# Altium schematic symbol library LATTICEPLDS_Library.SchLib: 291 symbols (part 8 of 32) (continued)
## LFE2-20E-F672 (continued)
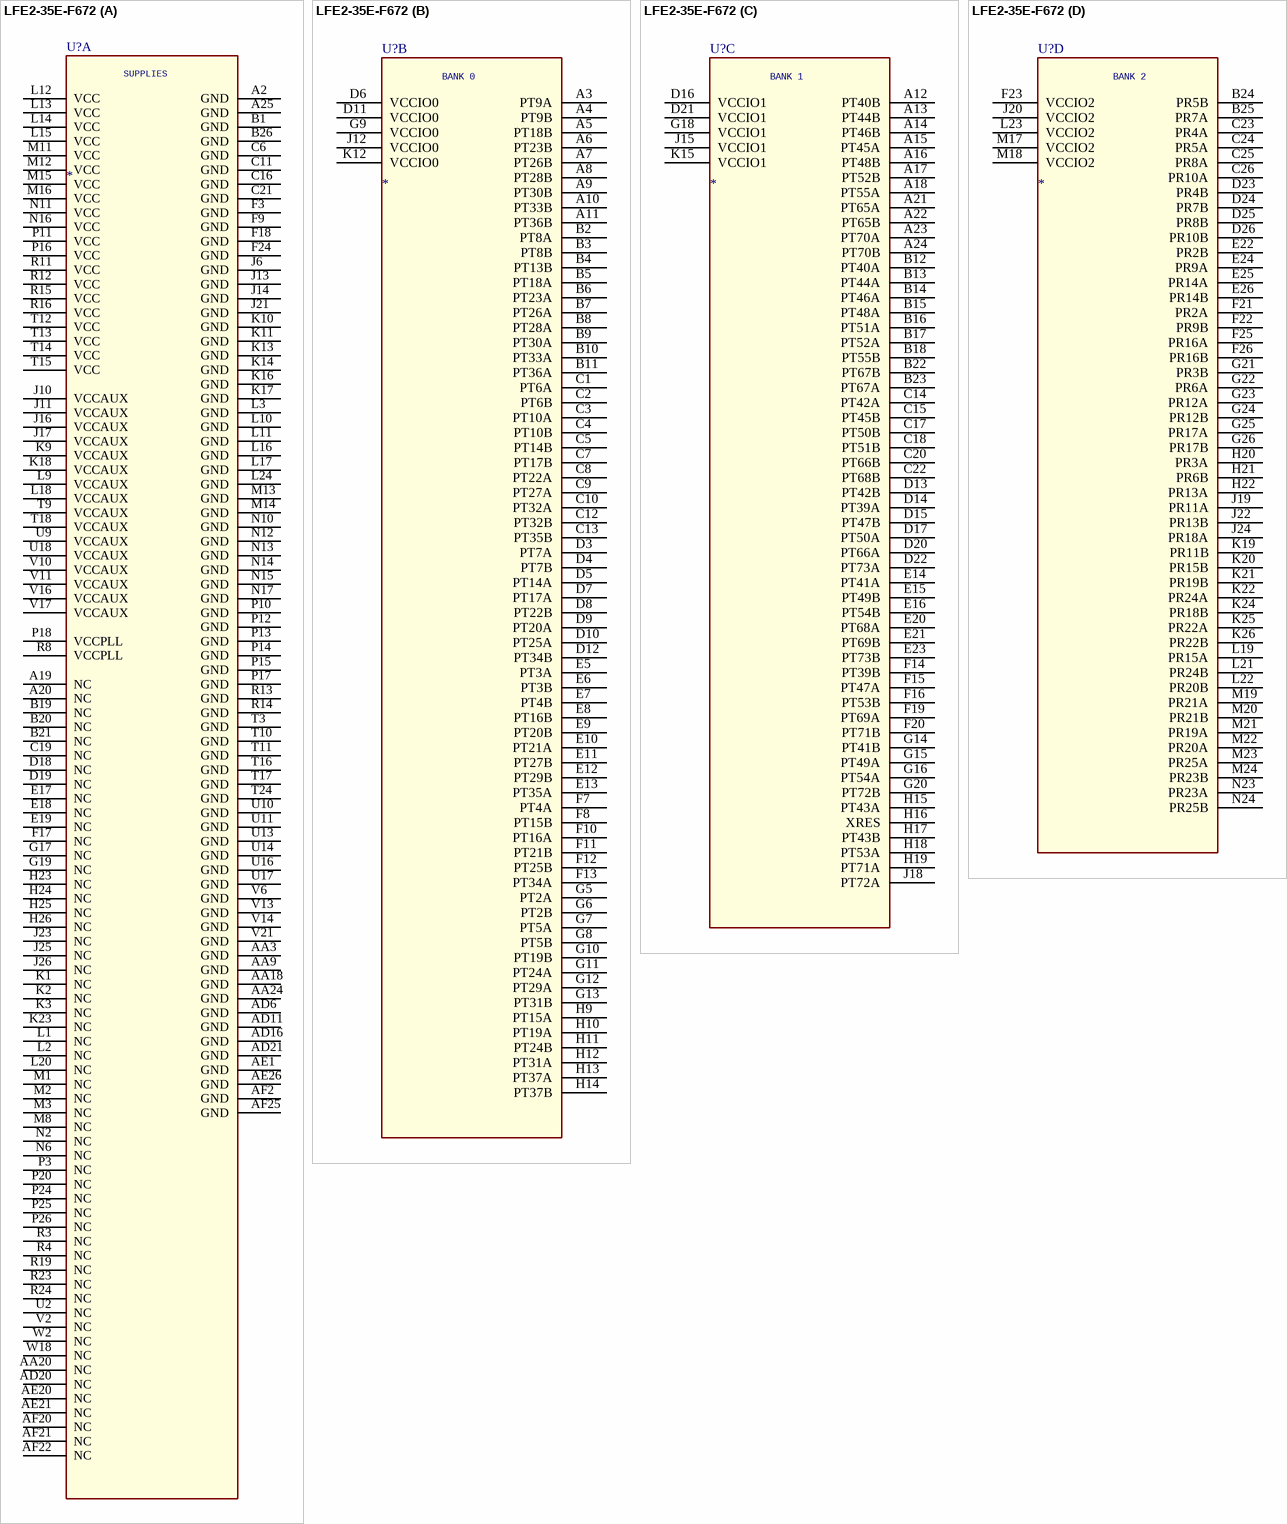
[diagram p83: symbol LFE2-35E-F672]
part A text: SUPPLIES
part B text: BANK0
part C text: BANK1
part D text: BANK2
part E text: BANK3
part F text: BANK4
part G text: BANK5
part H text: BANK6
part I text: BANK7
part J text: BANK8

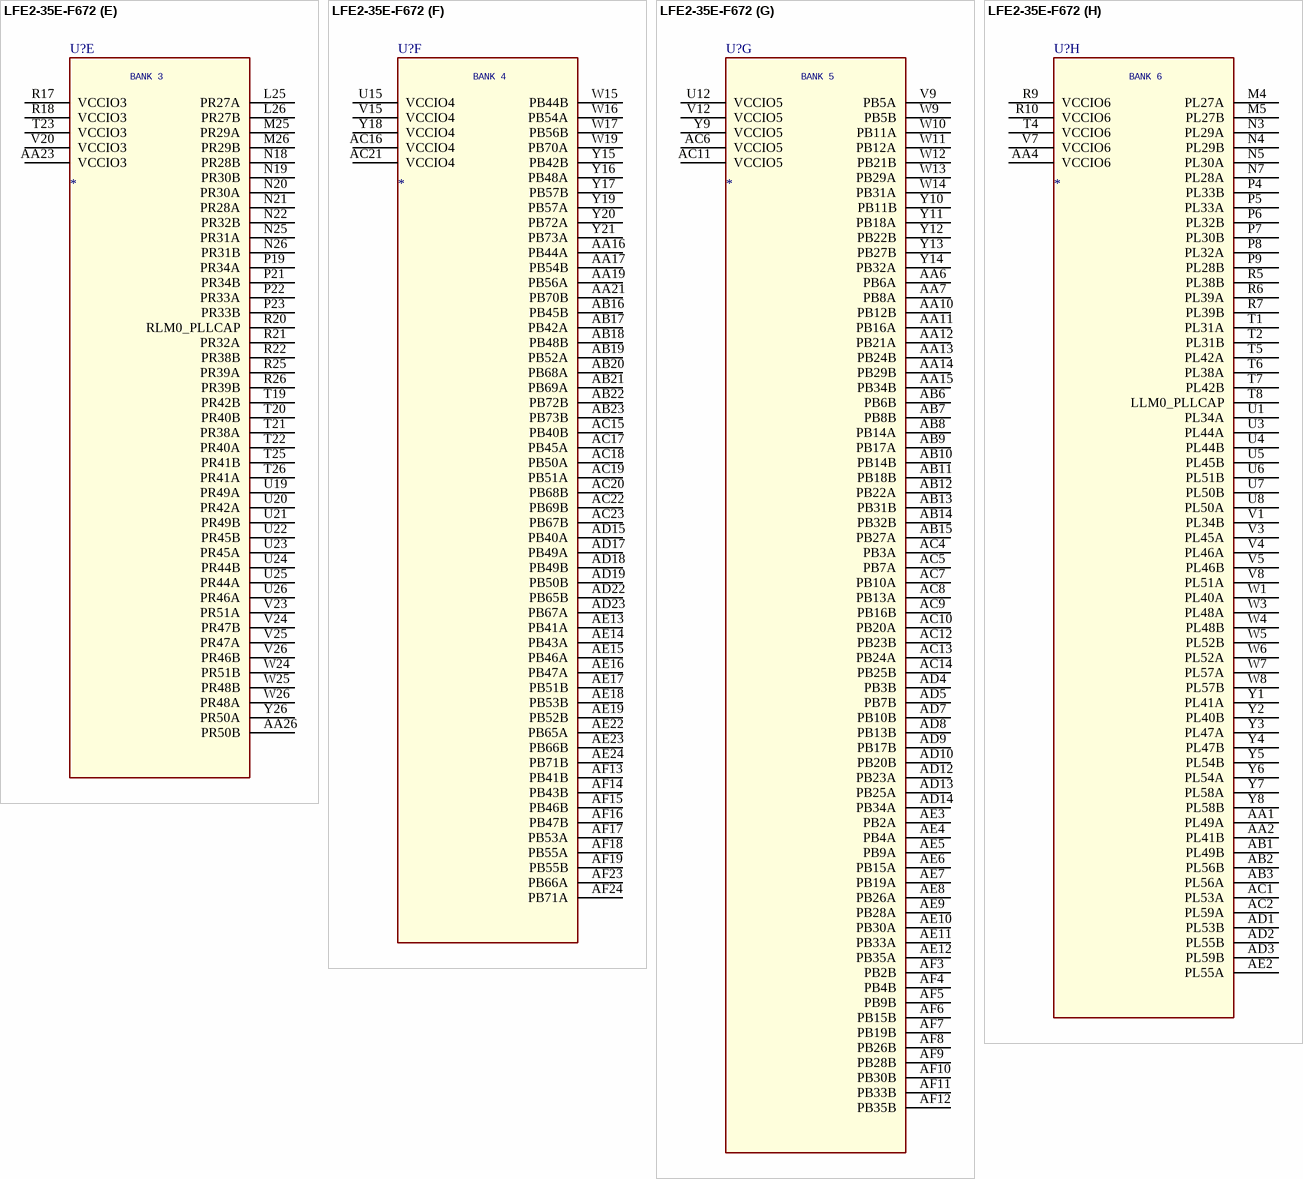
[diagram p84: symbol LFE2-35E-F672]

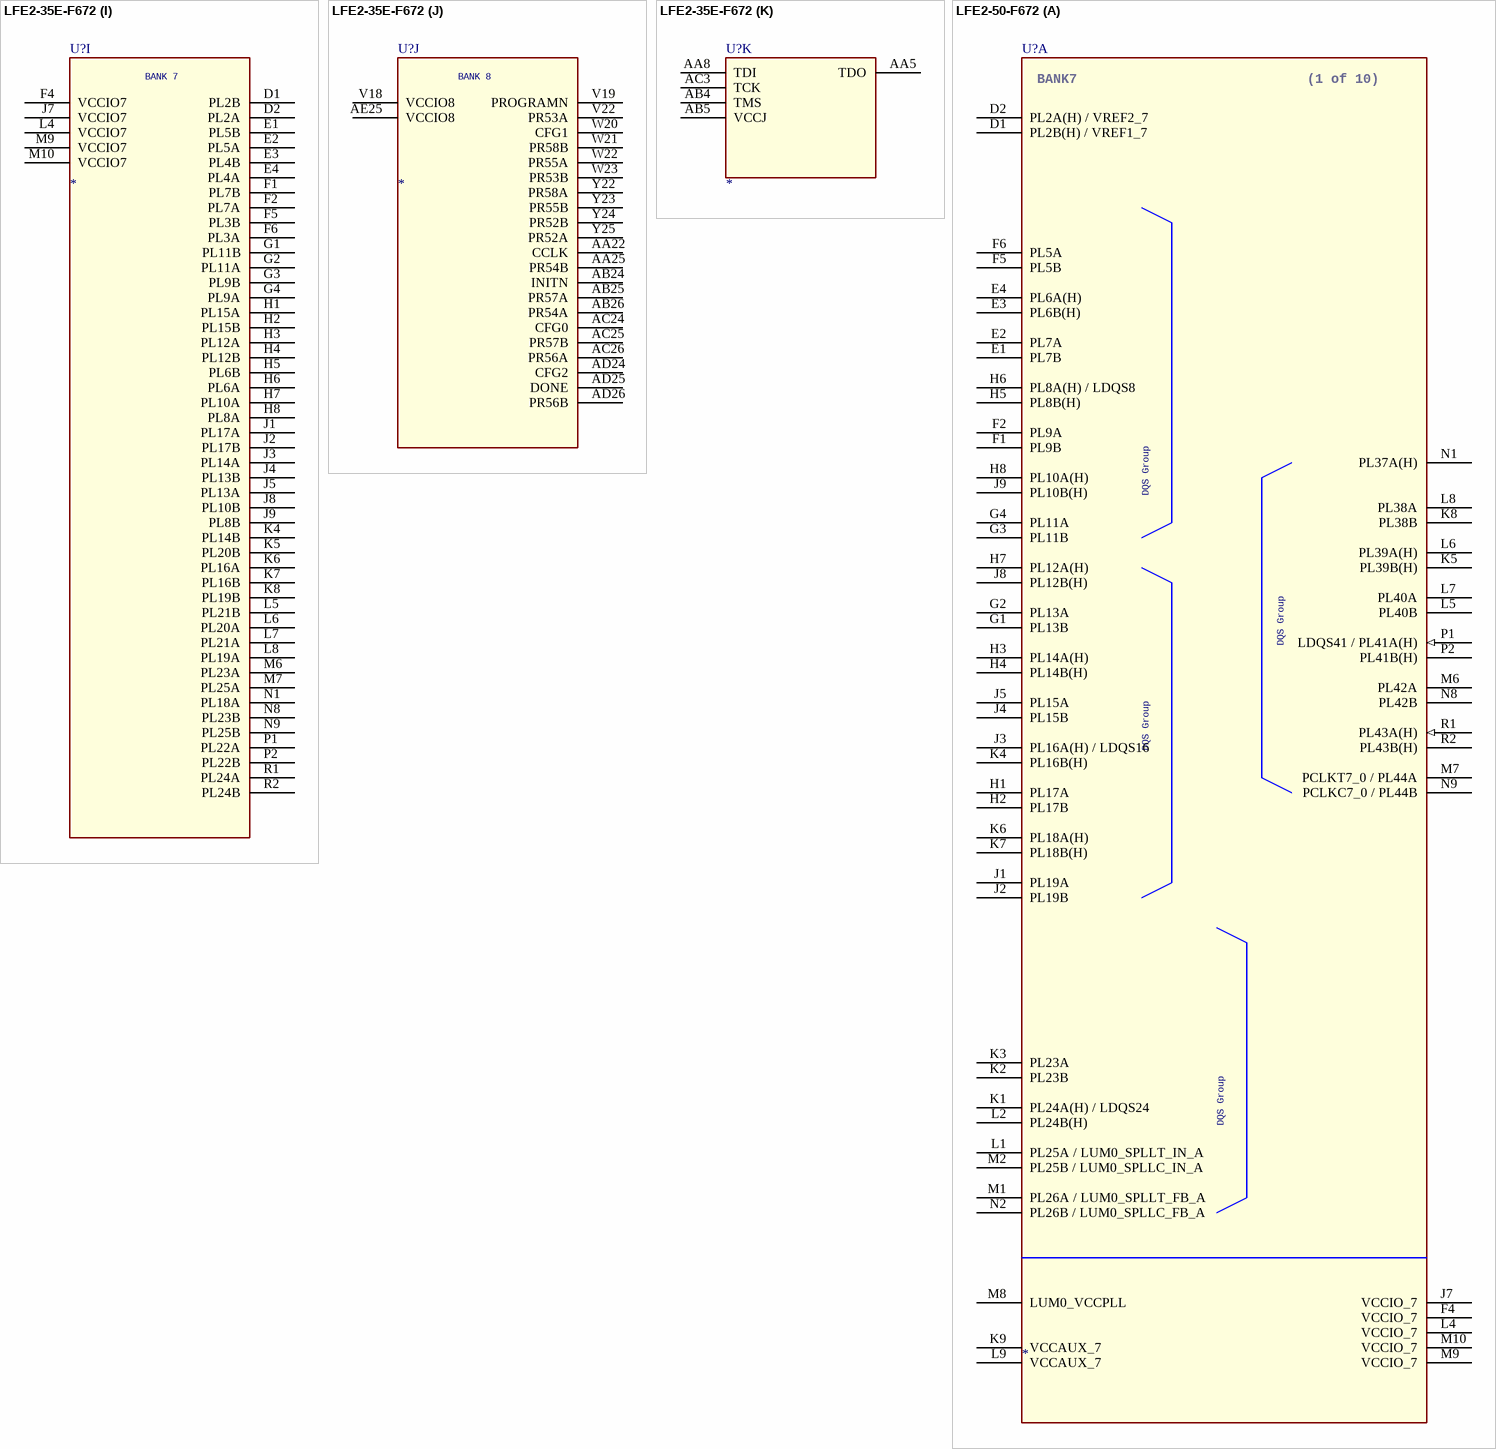
[diagram p85: symbols LFE2-35E-F672 to LFE2-50-F672]

## LFE2-35E-F672
designator U?
SPLIT_INST: TRUE; SWAP_INFO: (S1+S2+S3+S4+S5+S6+S7+S8+S9+S10+S11)
part A pins: A2 GND (power), A19 NC, A20 NC, A25 GND (power), AA3 GND (power), AA9 GND (power), AA18 GND (power), AA20 NC, AA24 GND (power), AD6 GND (power), AD11 GND (power), AD16 GND (power), AD20 NC, AD21 GND (power), AE1 GND (power), AE20 NC, AE21 NC, AE26 GND (power), AF2 GND (power), AF20 NC, AF21 NC, AF22 NC, AF25 GND (power), B1 GND (power), B19 NC, B20 NC, B21 NC, B26 GND (power), C6 GND (power), C11 GND (power), C16 GND (power), C19 NC, C21 GND (power), D18 NC, D19 NC, E17 NC, E18 NC, E19 NC, F3 GND (power), F9 GND (power), F17 NC, F18 GND (power), F24 GND (power), G17 NC, G19 NC, H23 NC, H24 NC, H25 NC, H26 NC, J6 GND (power), J10 VCCAUX (power), J11 VCCAUX (power), J13 GND (power), J14 GND (power), J16 VCCAUX (power), J17 VCCAUX (power), J21 GND (power), J23 NC, J25 NC, J26 NC, K1 NC, K2 NC, K3 NC, K9 VCCAUX (power), K10 GND (power), K11 GND (power), K13 GND (power), K14 GND (power), K16 GND (power), K17 GND (power), K18 VCCAUX (power), K23 NC, L1 NC, L2 NC, L3 GND (power), L9 VCCAUX (power), L10 GND (power), L11 GND (power), L12 VCC (power), L13 VCC (power), L14 VCC (power), L15 VCC (power), L16 GND (power), L17 GND (power), L18 VCCAUX (power), L20 NC, L24 GND (power), M1 NC, M2 NC, M3 NC, M8 NC, M11 VCC (power), M12 VCC (power), M13 GND (power), M14 GND (power), M15 VCC (power), M16 VCC (power), N2 NC, N6 NC, N10 GND (power), N11 VCC (power), N12 GND (power), N13 GND (power), N14 GND (power), N15 GND (power), N16 VCC (power), N17 GND (power), P3 NC, P10 GND (power), P11 VCC (power), P12 GND (power), P13 GND (power), P14 GND (power), P15 GND (power), P16 VCC (power), P17 GND (power), P18 VCCPLL (power), P20 NC, P24 NC, P25 NC, P26 NC, R3 NC, R4 NC, R8 VCCPLL (power), R11 VCC (power), R12 VCC (power), R13 GND (power), R14 GND (power), R15 VCC (power), R16 VCC (power), R19 NC, R23 NC, R24 NC, T3 GND (power), T9 VCCAUX (power), T10 GND (power), T11 GND (power), T12 VCC (power), T13 VCC (power), T14 VCC (power), T15 VCC (power), T16 GND (power), T17 GND (power), T18 VCCAUX (power), T24 GND (power), U2 NC, U9 VCCAUX (power), U10 GND (power), U11 GND (power), U13 GND (power), U14 GND (power), U16 GND (power), U17 GND (power), U18 VCCAUX (power), V2 NC, V6 GND (power), V10 VCCAUX (power), V11 VCCAUX (power), V13 GND (power), V14 GND (power), V16 VCCAUX (power), V17 VCCAUX (power), V21 GND (power), W2 NC, W18 NC
part B pins: A3 PT9A, A4 PT9B, A5 PT18B, A6 PT23B, A7 PT26B, A8 PT28B, A9 PT30B, A10 PT33B, A11 PT36B, B2 PT8A, B3 PT8B, B4 PT13B, B5 PT18A, B6 PT23A, B7 PT26A, B8 PT28A, B9 PT30A, B10 PT33A, B11 PT36A, C1 PT6A, C2 PT6B, C3 PT10A, C4 PT10B, C5 PT14B, C7 PT17B, C8 PT22A, C9 PT27A, C10 PT32A, C12 PT32B, C13 PT35B, D3 PT7A, D4 PT7B, D5 PT14A, D6 VCCIO0 (power), D7 PT17A, D8 PT22B, D9 PT20A, D10 PT25A, D11 VCCIO0 (power), D12 PT34B, E5 PT3A, E6 PT3B, E7 PT4B, E8 PT16B, E9 PT20B, E10 PT21A, E11 PT27B, E12 PT29B, E13 PT35A, F7 PT4A, F8 PT15B, F10 PT16A, F11 PT21B, F12 PT25B, F13 PT34A, G5 PT2A, G6 PT2B, G7 PT5A, G8 PT5B, G9 VCCIO0 (power), G10 PT19B, G11 PT24A, G12 PT29A, G13 PT31B, H9 PT15A, H10 PT19A, H11 PT24B, H12 PT31A, H13 PT37A, H14 PT37B, J12 VCCIO0 (power), K12 VCCIO0 (power)
part C pins: A12 PT40B, A13 PT44B, A14 PT46B, A15 PT45A, A16 PT48B, A17 PT52B, A18 PT55A, A21 PT65A, A22 PT65B, A23 PT70A, A24 PT70B, B12 PT40A, B13 PT44A, B14 PT46A, B15 PT48A, B16 PT51A, B17 PT52A, B18 PT55B, B22 PT67B, B23 PT67A, C14 PT42A, C15 PT45B, C17 PT50B, C18 PT51B, C20 PT66B, C22 PT68B, D13 PT42B, D14 PT39A, D15 PT47B, D16 VCCIO1 (power), D17 PT50A, D20 PT66A, D21 VCCIO1 (power), D22 PT73A, E14 PT41A, E15 PT49B, E16 PT54B, E20 PT68A, E21 PT69B, E23 PT73B, F14 PT39B, F15 PT47A, F16 PT53B, F19 PT69A, F20 PT71B, G14 PT41B, G15 PT49A, G16 PT54A, G18 VCCIO1 (power), G20 PT72B, H15 PT43A, H16 XRES, H17 PT43B, H18 PT53A, H19 PT71A, J15 VCCIO1 (power), J18 PT72A, K15 VCCIO1 (power)
part D pins: B24 PR5B, B25 PR7A, C23 PR4A, C24 PR5A, C25 PR8A, C26 PR10A, D23 PR4B, D24 PR7B, D25 PR8B, D26 PR10B, E22 PR2B, E24 PR9A, E25 PR14A, E26 PR14B, F21 PR2A, F22 PR9B, F23 VCCIO2 (power), F25 PR16A, F26 PR16B, G21 PR3B, G22 PR6A, G23 PR12A, G24 PR12B, G25 PR17A, G26 PR17B, H20 PR3A, H21 PR6B, H22 PR13A, J19 PR11A, J20 VCCIO2 (power), J22 PR13B, J24 PR18A, K19 PR11B, K20 PR15B, K21 PR19B, K22 PR24A, K24 PR18B, K25 PR22A, K26 PR22B, L19 PR15A, L21 PR24B, L22 PR20B, L23 VCCIO2 (power), M17 VCCIO2 (power), M18 VCCIO2 (power), M19 PR21A, M20 PR21B, M21 PR19A, M22 PR20A, M23 PR25A, M24 PR23B, N23 PR23A, N24 PR25B
part E pins: AA23 VCCIO3 (power), AA26 PR50B, L25 PR27A, L26 PR27B, M25 PR29A, M26 PR29B, N18 PR28B, N19 PR30B, N20 PR30A, N21 PR28A, N22 PR32B, N25 PR31A, N26 PR31B, P19 PR34A, P21 PR34B, P22 PR33A, P23 PR33B, R17 VCCIO3 (power), R18 VCCIO3 (power), R20 RLM0_PLLCAP, R21 PR32A, R22 PR38B, R25 PR39A, R26 PR39B, T19 PR42B, T20 PR40B, T21 PR38A, T22 PR40A, T23 VCCIO3 (power), T25 PR41B, T26 PR41A, U19 PR49A, U20 PR42A, U21 PR49B, U22 PR45B, U23 PR45A, U24 PR44B, U25 PR44A, U26 PR46A, V20 VCCIO3 (power), V23 PR51A, V24 PR47B, V25 PR47A, V26 PR46B, W24 PR51B, W25 PR48B, W26 PR48A, Y26 PR50A
part F pins: AA16 PB44A, AA17 PB54B, AA19 PB56A, AA21 PB70B, AB16 PB45B, AB17 PB42A, AB18 PB48B, AB19 PB52A, AB20 PB68A, AB21 PB69A, AB22 PB72B, AB23 PB73B, AC15 PB40B, AC16 VCCIO4 (power), AC17 PB45A, AC18 PB50A, AC19 PB51A, AC20 PB68B, AC21 VCCIO4 (power), AC22 PB69B, AC23 PB67B, AD15 PB40A, AD17 PB49A, AD18 PB49B, AD19 PB50B, AD22 PB65B, AD23 PB67A, AE13 PB41A, AE14 PB43A, AE15 PB46A, AE16 PB47A, AE17 PB51B, AE18 PB53B, AE19 PB52B, AE22 PB65A, AE23 PB66B, AE24 PB71B, AF13 PB41B, AF14 PB43B, AF15 PB46B, AF16 PB47B, AF17 PB53A, AF18 PB55A, AF19 PB55B, AF23 PB66A, AF24 PB71A, U15 VCCIO4 (power), V15 VCCIO4 (power), W15 PB44B, W16 PB54A, W17 PB56B, W19 PB70A, Y15 PB42B, Y16 PB48A, Y17 PB57B, Y18 VCCIO4 (power), Y19 PB57A, Y20 PB72A, Y21 PB73A
part G pins: AA6 PB6A, AA7 PB8A, AA10 PB12B, AA11 PB16A, AA12 PB21A, AA13 PB24B, AA14 PB29B, AA15 PB34B, AB6 PB6B, AB7 PB8B, AB8 PB14A, AB9 PB17A, AB10 PB14B, AB11 PB18B, AB12 PB22A, AB13 PB31B, AB14 PB32B, AB15 PB27A, AC4 PB3A, AC5 PB7A, AC6 VCCIO5 (power), AC7 PB10A, AC8 PB13A, AC9 PB16B, AC10 PB20A, AC11 VCCIO5 (power), AC12 PB23B, AC13 PB24A, AC14 PB25B, AD4 PB3B, AD5 PB7B, AD7 PB10B, AD8 PB13B, AD9 PB17B, AD10 PB20B, AD12 PB23A, AD13 PB25A, AD14 PB34A, AE3 PB2A, AE4 PB4A, AE5 PB9A, AE6 PB15A, AE7 PB19A, AE8 PB26A, AE9 PB28A, AE10 PB30A, AE11 PB33A, AE12 PB35A, AF3 PB2B, AF4 PB4B, AF5 PB9B, AF6 PB15B, AF7 PB19B, AF8 PB26B, AF9 PB28B, AF10 PB30B, AF11 PB33B, AF12 PB35B, U12 VCCIO5 (power), V9 PB5A, V12 VCCIO5 (power), W9 PB5B, W10 PB11A, W11 PB12A, W12 PB21B, W13 PB29A, W14 PB31A, Y9 VCCIO5 (power), Y10 PB11B, Y11 PB18A, Y12 PB22B, Y13 PB27B, Y14 PB32A
part H pins: AA1 PL49A, AA2 PL41B, AA4 VCCIO6 (power), AB1 PL49B, AB2 PL56B, AB3 PL56A, AC1 PL53A, AC2 PL59A, AD1 PL53B, AD2 PL55B, AD3 PL59B, AE2 PL55A, M4 PL27A, M5 PL27B, N3 PL29A, N4 PL29B, N5 PL30A, N7 PL28A, P4 PL33B, P5 PL33A, P6 PL32B, P7 PL30B, P8 PL32A, P9 PL28B, R5 PL38B, R6 PL39A, R7 PL39B, R9 VCCIO6 (power), R10 VCCIO6 (power), T1 PL31A, T2 PL31B, T4 VCCIO6 (power), T5 PL42A, T6 PL38A, T7 PL42B, T8 LLM0_PLLCAP, U1 PL34A, U3 PL44A, U4 PL44B, U5 PL45B, U6 PL51B, U7 PL50B, U8 PL50A, V1 PL34B, V3 PL45A, V4 PL46A, V5 PL46B, V7 VCCIO6 (power), V8 PL51A, W1 PL40A, W3 PL48A, W4 PL48B, W5 PL52B, W6 PL52A, W7 PL57A, W8 PL57B, Y1 PL41A, Y2 PL40B, Y3 PL47A, Y4 PL47B, Y5 PL54B, Y6 PL54A, Y7 PL58A, Y8 PL58B
part I pins: D1 PL2B, D2 PL2A, E1 PL5B, E2 PL5A, E3 PL4B, E4 PL4A, F1 PL7B, F2 PL7A, F4 VCCIO7 (power), F5 PL3B, F6 PL3A, G1 PL11B, G2 PL11A, G3 PL9B, G4 PL9A, H1 PL15A, H2 PL15B, H3 PL12A, H4 PL12B, H5 PL6B, H6 PL6A, H7 PL10A, H8 PL8A, J1 PL17A, J2 PL17B, J3 PL14A, J4 PL13B, J5 PL13A, J7 VCCIO7 (power), J8 PL10B, J9 PL8B, K4 PL14B, K5 PL20B, K6 PL16A, K7 PL16B, K8 PL19B, L4 VCCIO7 (power), L5 PL21B, L6 PL20A, L7 PL21A, L8 PL19A, M6 PL23A, M7 PL25A, M9 VCCIO7 (power), M10 VCCIO7 (power), N1 PL18A, N8 PL23B, N9 PL25B, P1 PL22A, P2 PL22B, R1 PL24A, R2 PL24B
part J pins: AA22 CCLK, AA25 PR54B, AB24 INITN, AB25 PR57A, AB26 PR54A, AC24 CFG0, AC25 PR57B, AC26 PR56A, AD24 CFG2, AD25 DONE, AD26 PR56B, AE25 VCCIO8 (power), V18 VCCIO8 (power), V19 PROGRAMN, V22 PR53A, W20 CFG1, W21 PR58B, W22 PR55A, W23 PR53B, Y22 PR58A, Y23 PR55B, Y24 PR52B, Y25 PR52A
part K pins: AA5 TDO, AA8 TDI, AB4 TMS, AB5 VCCJ, AC3 TCK
part A text: SUPPLIES
part B text: BANK 0
part C text: BANK 1
part D text: BANK 2
part E text: BANK 3
part F text: BANK 4
part G text: BANK 5
part H text: BANK 6
part I text: BANK 7
part J text: BANK 8

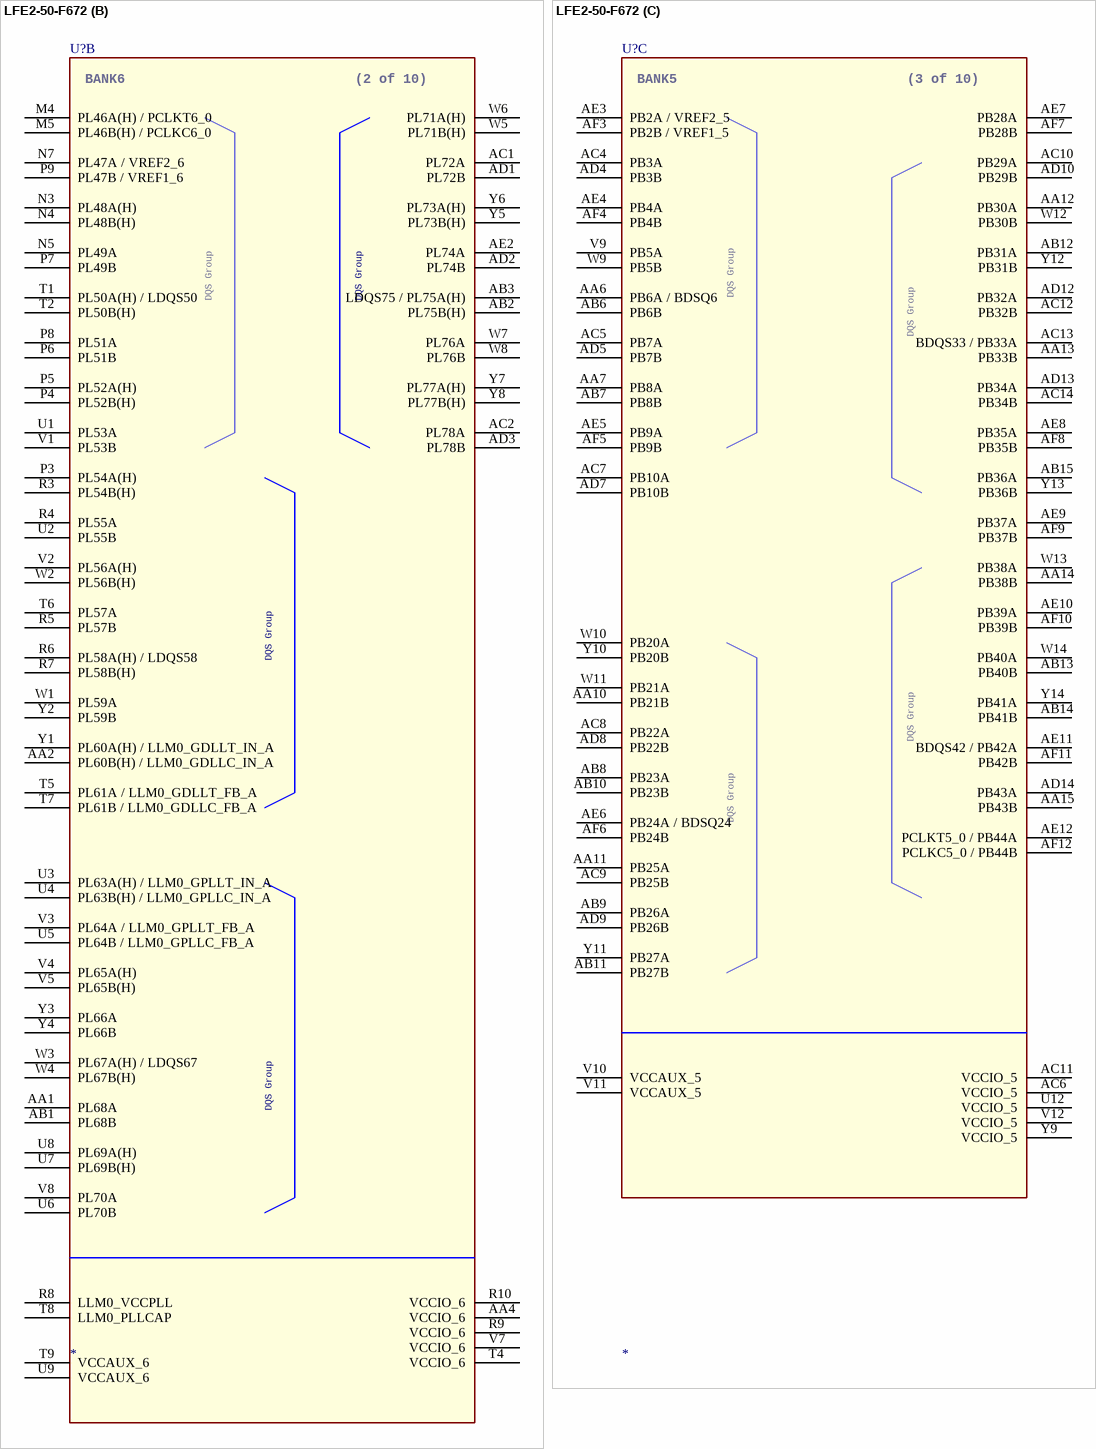
[diagram p86: symbol LFE2-50-F672]

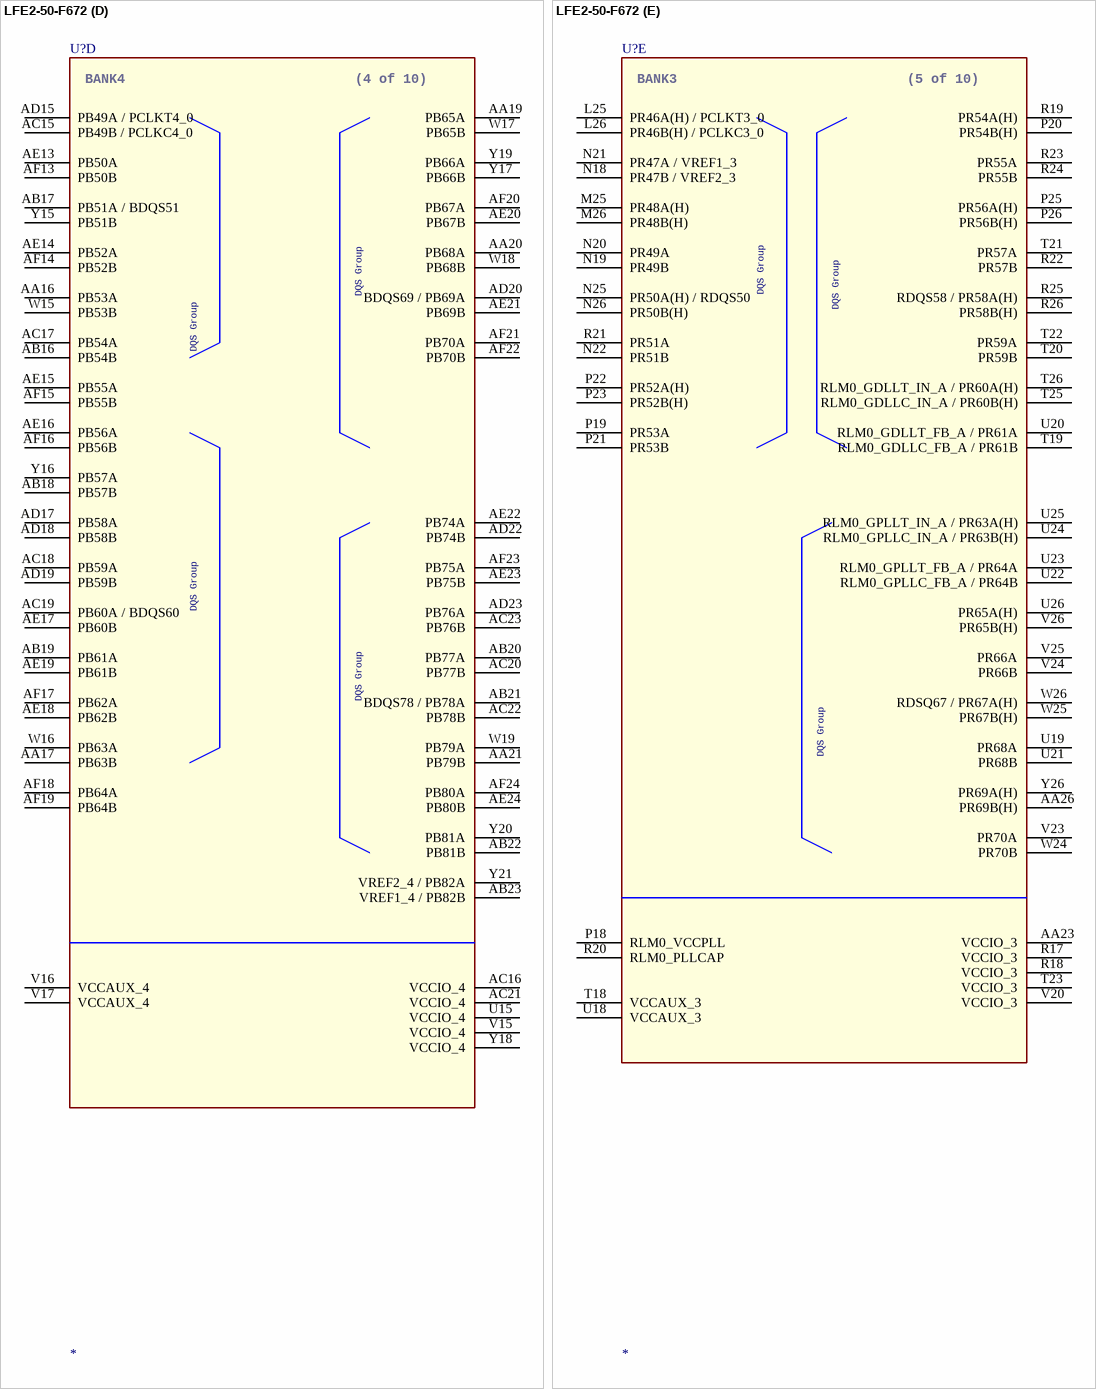
[diagram p87: symbol LFE2-50-F672]

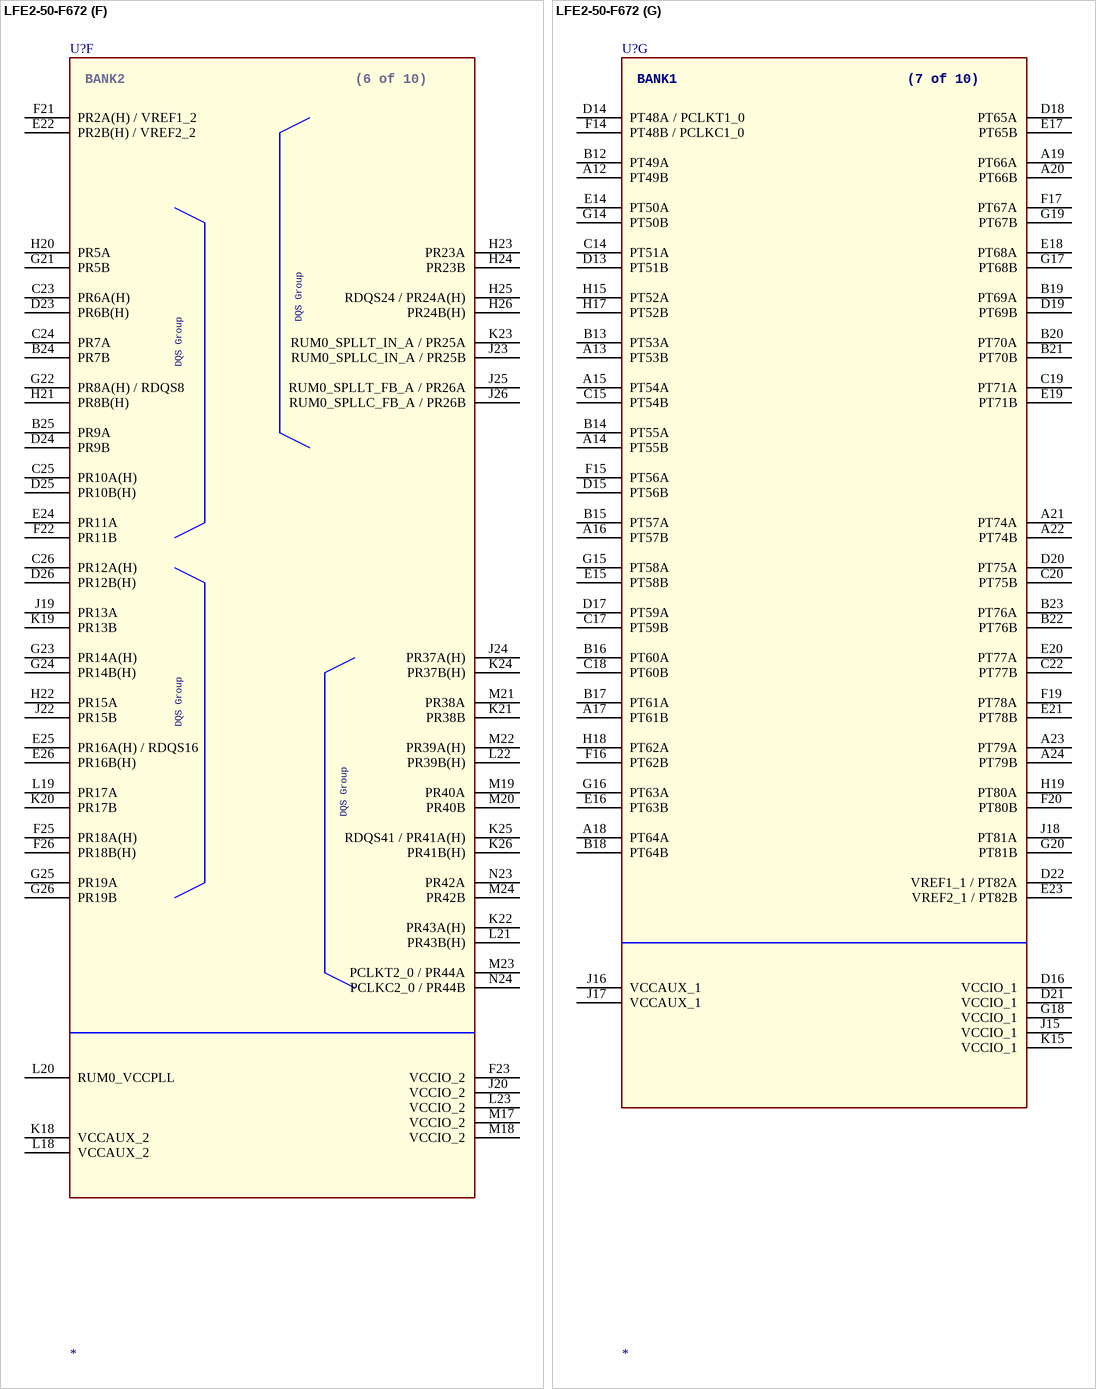
[diagram p88: symbol LFE2-50-F672]

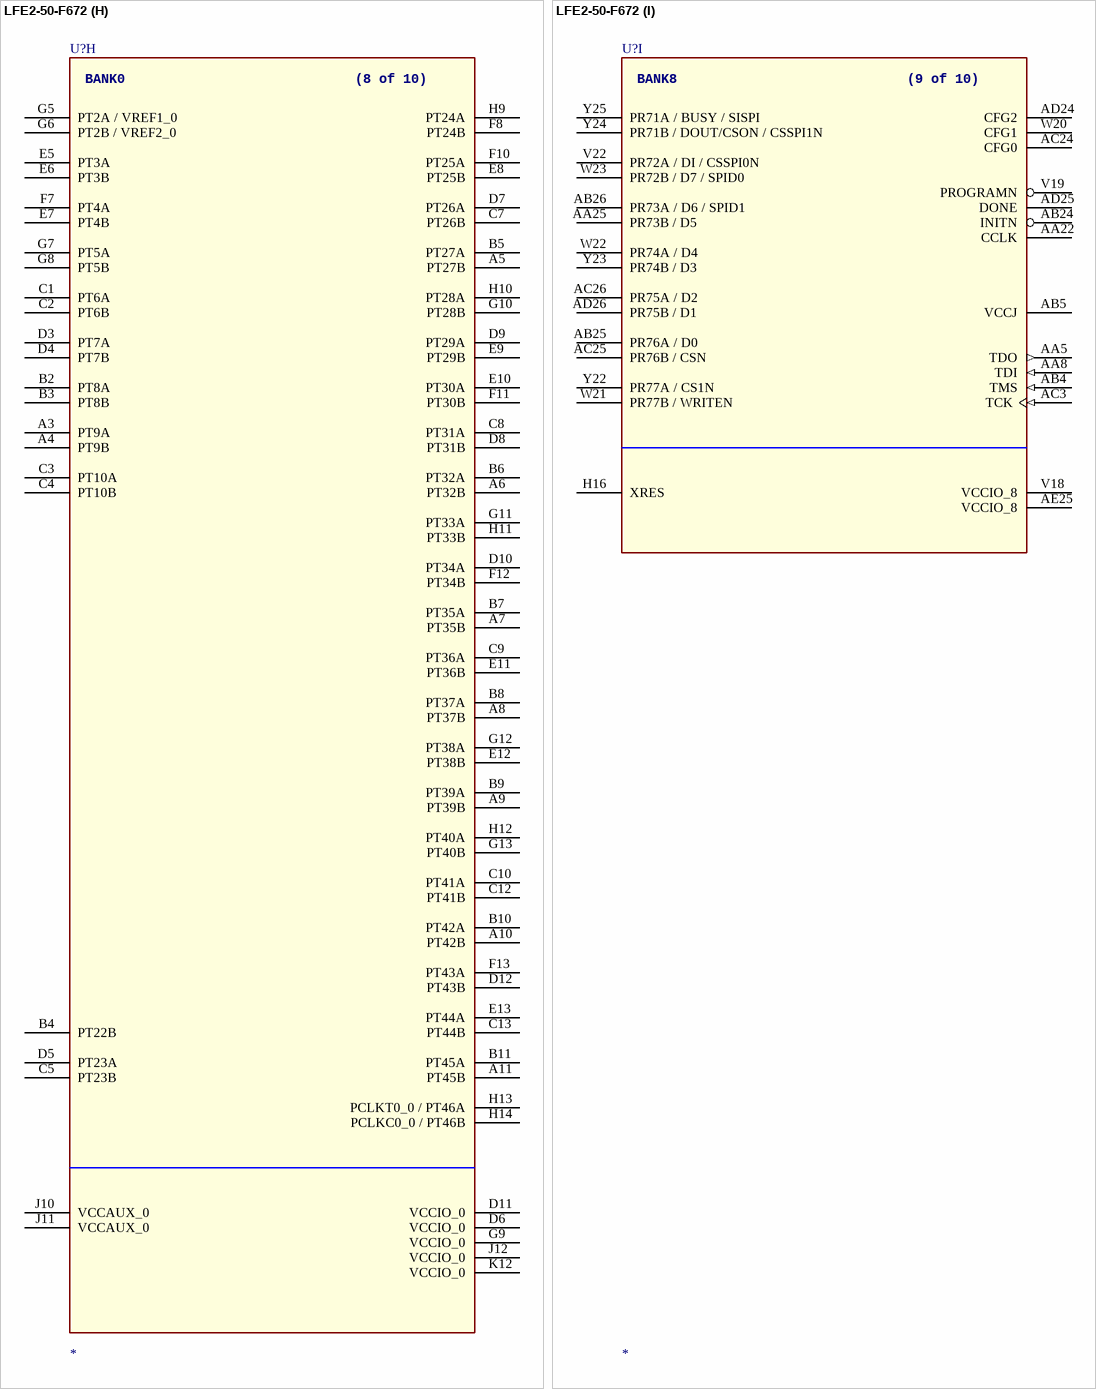
[diagram p89: symbol LFE2-50-F672]

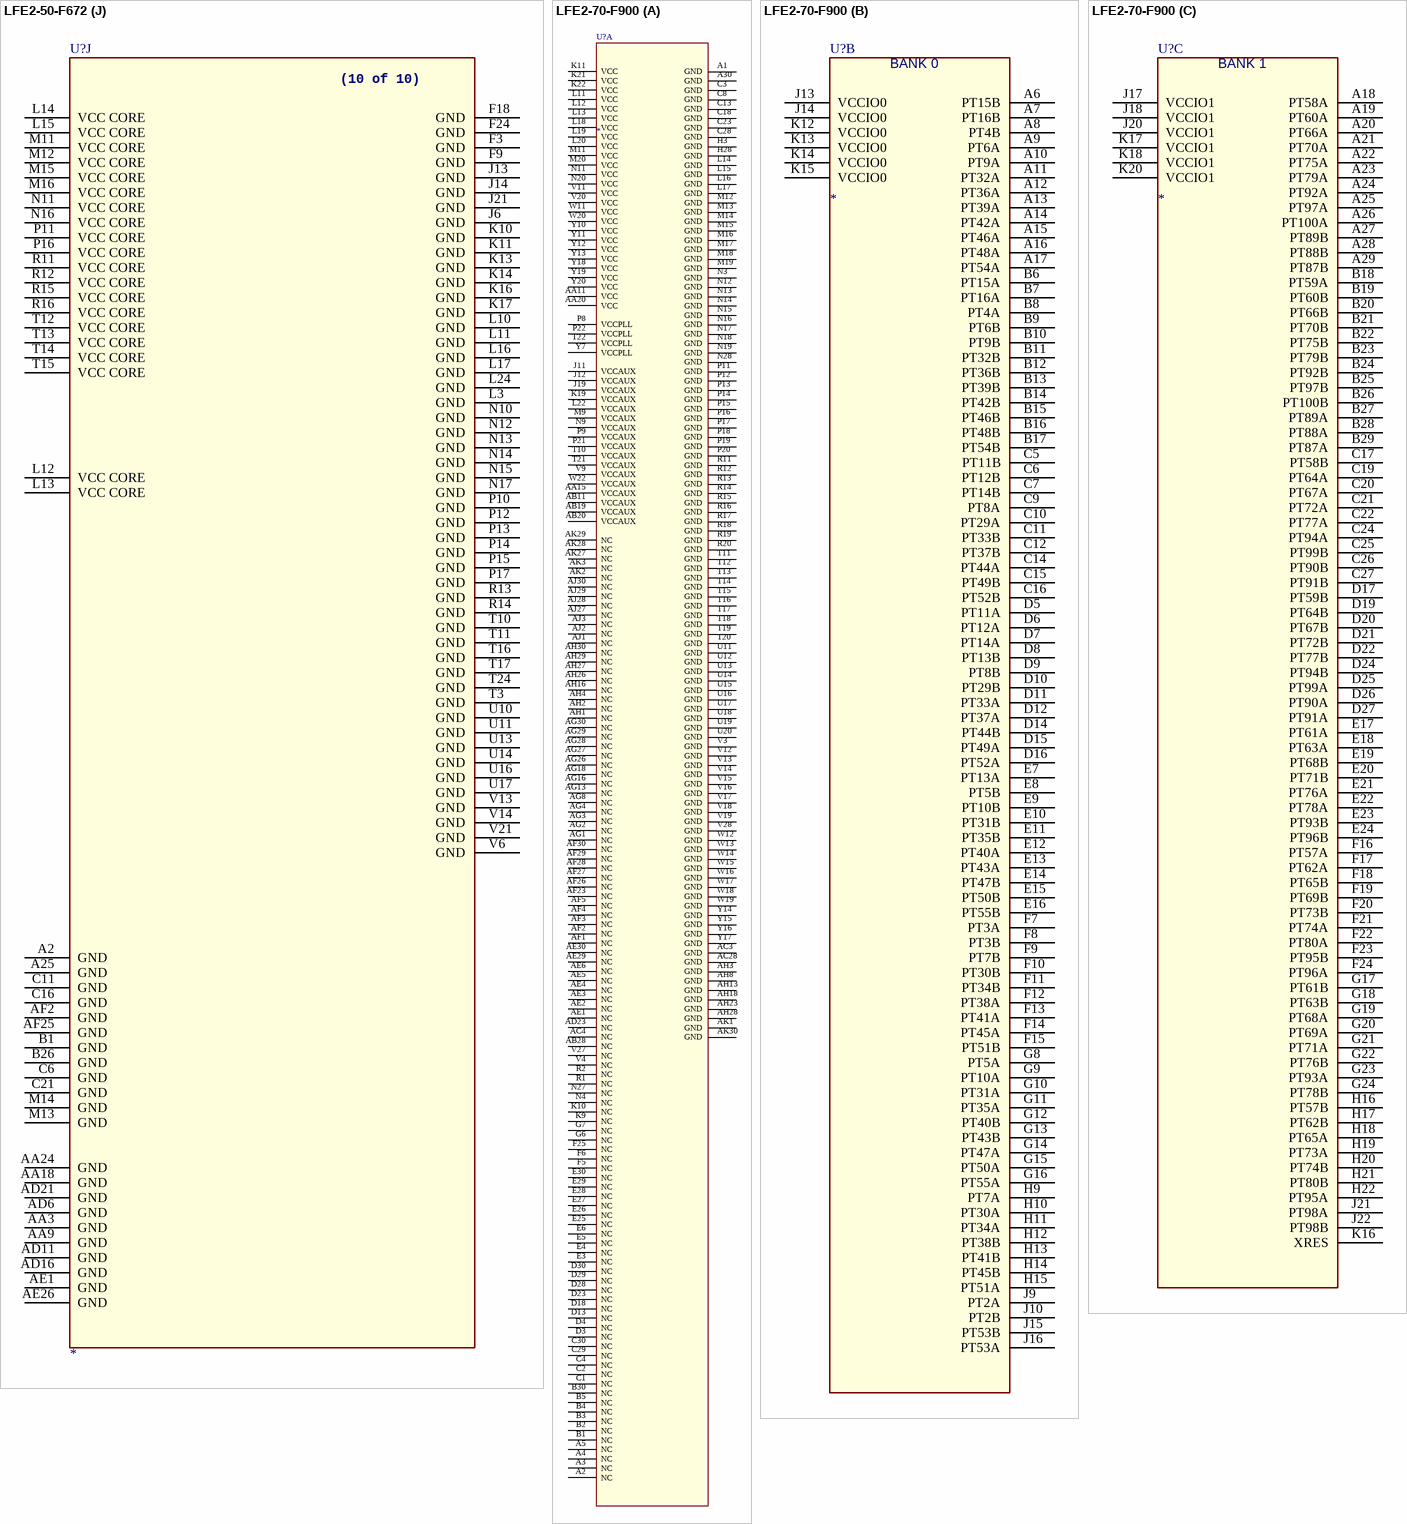
[diagram p90: symbols LFE2-50-F672 to LFE2-70-F900]